# Altium footprint library ST封装.PcbLib: 1336 footprints (part 87 of 109)
Each footprint in its own frame and in the unit in brackets; x right, y up, seen from the top. Pads: shape width x height; smd on the part's side, far side on the other; paste and mask are expansions set on the pad; w line width, h text height; cw(c..) or ccw(c..) is an arc to the next point about the centre after c.
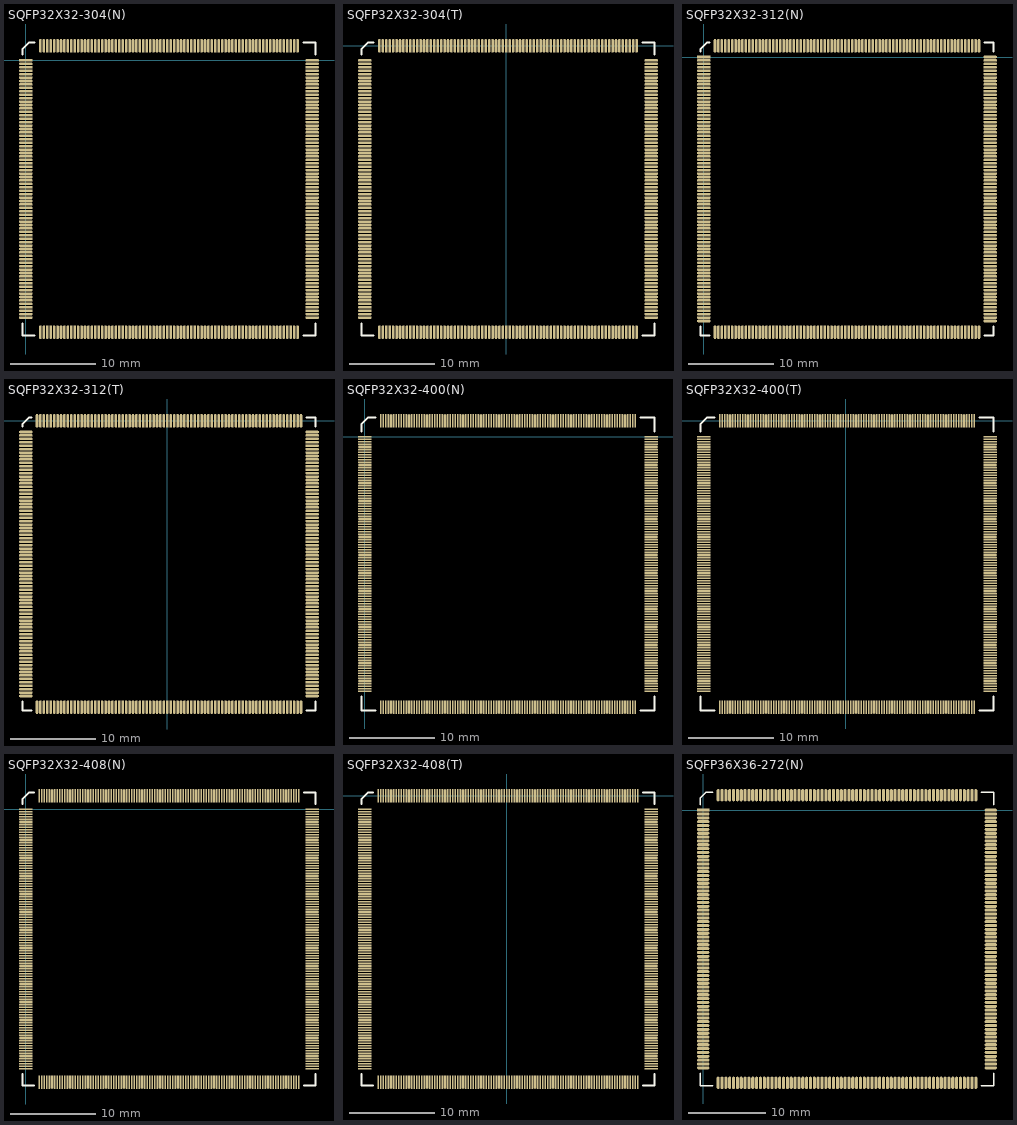
[diagram p86: the footprints below, top view; thin cyan lines are the x and y axes]

## SQFP32X32-304(N) [mm]
pads (304):
  rect 1.6x0.3 smd: 1(0,0)
  oval 1.6x0.3 smd: 2(0,-0.4) 3(0,-0.8) 4(0,-1.2) 5(0,-1.6) 6(0,-2) 7(0,-2.4) 8(0,-2.8) 9(0,-3.2) 10(0,-3.6) 11(0,-4) 12(0,-4.4) 13(0,-4.8) 14(0,-5.2) 15(0,-5.6) 16(0,-6) 17(0,-6.4) 18(0,-6.8) 19(0,-7.2) 20(0,-7.6) 21(0,-8) 22(0,-8.4) 23(0,-8.8) 24(0,-9.2) 25(0,-9.6) 26(0,-10) 27(0,-10.4) 28(0,-10.8) 29(0,-11.2) 30(0,-11.6) 31(0,-12) 32(0,-12.4) 33(0,-12.8) 34(0,-13.2) 35(0,-13.6) 36(0,-14) 37(0,-14.4) 38(0,-14.8) 39(0,-15.2) 40(0,-15.6) 41(0,-16) 42(0,-16.4) 43(0,-16.8) 44(0,-17.2) 45(0,-17.6) 46(0,-18) 47(0,-18.4) 48(0,-18.8) 49(0,-19.2) 50(0,-19.6) 51(0,-20) 52(0,-20.4) 53(0,-20.8) 54(0,-21.2) 55(0,-21.6) 56(0,-22) 57(0,-22.4) 58(0,-22.8) 59(0,-23.2) 60(0,-23.6) 61(0,-24) 62(0,-24.4) 63(0,-24.8) 64(0,-25.2) 65(0,-25.6) 66(0,-26) 67(0,-26.4) 68(0,-26.8) 69(0,-27.2) 70(0,-27.6) 71(0,-28) 72(0,-28.4) 73(0,-28.8) 74(0,-29.2) 75(0,-29.6) 76(0,-30) 153(33.4,-30) 154(33.4,-29.6) 155(33.4,-29.2) 156(33.4,-28.8) 157(33.4,-28.4) 158(33.4,-28) 159(33.4,-27.6) 160(33.4,-27.2) 161(33.4,-26.8) 162(33.4,-26.4) 163(33.4,-26) 164(33.4,-25.6) 165(33.4,-25.2) 166(33.4,-24.8) 167(33.4,-24.4) 168(33.4,-24) 169(33.4,-23.6) 170(33.4,-23.2) 171(33.4,-22.8) 172(33.4,-22.4) 173(33.4,-22) 174(33.4,-21.6) 175(33.4,-21.2) 176(33.4,-20.8) 177(33.4,-20.4) 178(33.4,-20) 179(33.4,-19.6) 180(33.4,-19.2) 181(33.4,-18.8) 182(33.4,-18.4) 183(33.4,-18) 184(33.4,-17.6) 185(33.4,-17.2) 186(33.4,-16.8) 187(33.4,-16.4) 188(33.4,-16) 189(33.4,-15.6) 190(33.4,-15.2) 191(33.4,-14.8) 192(33.4,-14.4) 193(33.4,-14) 194(33.4,-13.6) 195(33.4,-13.2) 196(33.4,-12.8) 197(33.4,-12.4) 198(33.4,-12) 199(33.4,-11.6) 200(33.4,-11.2) 201(33.4,-10.8) 202(33.4,-10.4) 203(33.4,-10) 204(33.4,-9.6) 205(33.4,-9.2) 206(33.4,-8.8) 207(33.4,-8.4) 208(33.4,-8) 209(33.4,-7.6) 210(33.4,-7.2) 211(33.4,-6.8) 212(33.4,-6.4) 213(33.4,-6) 214(33.4,-5.6) 215(33.4,-5.2) 216(33.4,-4.8) 217(33.4,-4.4) 218(33.4,-4) 219(33.4,-3.6) 220(33.4,-3.2) 221(33.4,-2.8) 222(33.4,-2.4) 223(33.4,-2) 224(33.4,-1.6) 225(33.4,-1.2) 226(33.4,-0.8) 227(33.4,-0.4) 228(33.4,0)
  oval 0.3x1.6 smd: 77(1.7,-31.7) 78(2.1,-31.7) 79(2.5,-31.7) 80(2.9,-31.7) 81(3.3,-31.7) 82(3.7,-31.7) 83(4.1,-31.7) 84(4.5,-31.7) 85(4.9,-31.7) 86(5.3,-31.7) 87(5.7,-31.7) 88(6.1,-31.7) 89(6.5,-31.7) 90(6.9,-31.7) 91(7.3,-31.7) 92(7.7,-31.7) 93(8.1,-31.7) 94(8.5,-31.7) 95(8.9,-31.7) 96(9.3,-31.7) 97(9.7,-31.7) 98(10.1,-31.7) 99(10.5,-31.7) 100(10.9,-31.7) 101(11.3,-31.7) 102(11.7,-31.7) 103(12.1,-31.7) 104(12.5,-31.7) 105(12.9,-31.7) 106(13.3,-31.7) 107(13.7,-31.7) 108(14.1,-31.7) 109(14.5,-31.7) 110(14.9,-31.7) 111(15.3,-31.7) 112(15.7,-31.7) 113(16.1,-31.7) 114(16.5,-31.7) 115(16.9,-31.7) 116(17.3,-31.7) 117(17.7,-31.7) 118(18.1,-31.7) 119(18.5,-31.7) 120(18.9,-31.7) 121(19.3,-31.7) 122(19.7,-31.7) 123(20.1,-31.7) 124(20.5,-31.7) 125(20.9,-31.7) 126(21.3,-31.7) 127(21.7,-31.7) 128(22.1,-31.7) 129(22.5,-31.7) 130(22.9,-31.7) 131(23.3,-31.7) 132(23.7,-31.7) 133(24.1,-31.7) 134(24.5,-31.7) 135(24.9,-31.7) 136(25.3,-31.7) 137(25.7,-31.7) 138(26.1,-31.7) 139(26.5,-31.7) 140(26.9,-31.7) 141(27.3,-31.7) 142(27.7,-31.7) 143(28.1,-31.7) 144(28.5,-31.7) 145(28.9,-31.7) 146(29.3,-31.7) 147(29.7,-31.7) 148(30.1,-31.7) 149(30.5,-31.7) 150(30.9,-31.7) 151(31.3,-31.7) 152(31.7,-31.7) 229(31.7,1.7) 230(31.3,1.7) 231(30.9,1.7) 232(30.5,1.7) 233(30.1,1.7) 234(29.7,1.7) 235(29.3,1.7) 236(28.9,1.7) 237(28.5,1.7) 238(28.1,1.7) 239(27.7,1.7) 240(27.3,1.7) 241(26.9,1.7) 242(26.5,1.7) 243(26.1,1.7) 244(25.7,1.7) 245(25.3,1.7) 246(24.9,1.7) 247(24.5,1.7) 248(24.1,1.7) 249(23.7,1.7) 250(23.3,1.7) 251(22.9,1.7) 252(22.5,1.7) 253(22.1,1.7) 254(21.7,1.7) 255(21.3,1.7) 256(20.9,1.7) 257(20.5,1.7) 258(20.1,1.7) 259(19.7,1.7) 260(19.3,1.7) 261(18.9,1.7) 262(18.5,1.7) 263(18.1,1.7) 264(17.7,1.7) 265(17.3,1.7) 266(16.9,1.7) 267(16.5,1.7) 268(16.1,1.7) 269(15.7,1.7) 270(15.3,1.7) 271(14.9,1.7) 272(14.5,1.7) 273(14.1,1.7) 274(13.7,1.7) 275(13.3,1.7) 276(12.9,1.7) 277(12.5,1.7) 278(12.1,1.7) 279(11.7,1.7) 280(11.3,1.7) 281(10.9,1.7) 282(10.5,1.7) 283(10.1,1.7) 284(9.7,1.7) 285(9.3,1.7) 286(8.9,1.7) 287(8.5,1.7) 288(8.1,1.7) 289(7.7,1.7) 290(7.3,1.7) 291(6.9,1.7) 292(6.5,1.7) 293(6.1,1.7) 294(5.7,1.7) 295(5.3,1.7) 296(4.9,1.7) 297(4.5,1.7) 298(4.1,1.7) 299(3.7,1.7) 300(3.3,1.7) 301(2.9,1.7) 302(2.5,1.7) 303(2.1,1.7) 304(1.7,1.7)
Top Overlay:
  lines w0.2: -0.4,-30.65 -0.4,-32.1 1.05,-32.1 ; -0.4,0.65 -0.4,1.3 0.4,2.1 1.05,2.1 ; 32.35,-32.1 33.8,-32.1 33.8,-30.65 ; 32.35,2.1 33.8,2.1 33.8,0.65

## SQFP32X32-304(T) [mm]
pads (304):
  rect 0.3x1.6 smd: 1(0,0)
  oval 0.3x1.6 smd: 2(-0.4,0) 3(-0.8,0) 4(-1.2,0) 5(-1.6,0) 6(-2,0) 7(-2.4,0) 8(-2.8,0) 9(-3.2,0) 10(-3.6,0) 11(-4,0) 12(-4.4,0) 13(-4.8,0) 14(-5.2,0) 15(-5.6,0) 16(-6,0) 17(-6.4,0) 18(-6.8,0) 19(-7.2,0) 20(-7.6,0) 21(-8,0) 22(-8.4,0) 23(-8.8,0) 24(-9.2,0) 25(-9.6,0) 26(-10,0) 27(-10.4,0) 28(-10.8,0) 29(-11.2,0) 30(-11.6,0) 31(-12,0) 32(-12.4,0) 33(-12.8,0) 34(-13.2,0) 35(-13.6,0) 36(-14,0) 37(-14.4,0) 38(-14.8,0) 115(-14.8,-33.4) 116(-14.4,-33.4) 117(-14,-33.4) 118(-13.6,-33.4) 119(-13.2,-33.4) 120(-12.8,-33.4) 121(-12.4,-33.4) 122(-12,-33.4) 123(-11.6,-33.4) 124(-11.2,-33.4) 125(-10.8,-33.4) 126(-10.4,-33.4) 127(-10,-33.4) 128(-9.6,-33.4) 129(-9.2,-33.4) 130(-8.8,-33.4) 131(-8.4,-33.4) 132(-8,-33.4) 133(-7.6,-33.4) 134(-7.2,-33.4) 135(-6.8,-33.4) 136(-6.4,-33.4) 137(-6,-33.4) 138(-5.6,-33.4) 139(-5.2,-33.4) 140(-4.8,-33.4) 141(-4.4,-33.4) 142(-4,-33.4) 143(-3.6,-33.4) 144(-3.2,-33.4) 145(-2.8,-33.4) 146(-2.4,-33.4) 147(-2,-33.4) 148(-1.6,-33.4) 149(-1.2,-33.4) 150(-0.8,-33.4) 151(-0.4,-33.4) 152(0,-33.4) 153(0.4,-33.4) 154(0.8,-33.4) 155(1.2,-33.4) 156(1.6,-33.4) 157(2,-33.4) 158(2.4,-33.4) 159(2.8,-33.4) 160(3.2,-33.4) 161(3.6,-33.4) 162(4,-33.4) 163(4.4,-33.4) 164(4.8,-33.4) 165(5.2,-33.4) 166(5.6,-33.4) 167(6,-33.4) 168(6.4,-33.4) 169(6.8,-33.4) 170(7.2,-33.4) 171(7.6,-33.4) 172(8,-33.4) 173(8.4,-33.4) 174(8.8,-33.4) 175(9.2,-33.4) 176(9.6,-33.4) 177(10,-33.4) 178(10.4,-33.4) 179(10.8,-33.4) 180(11.2,-33.4) 181(11.6,-33.4) 182(12,-33.4) 183(12.4,-33.4) 184(12.8,-33.4) 185(13.2,-33.4) 186(13.6,-33.4) 187(14,-33.4) 188(14.4,-33.4) 189(14.8,-33.4) 190(15.2,-33.4) 267(15.2,0) 268(14.8,0) 269(14.4,0) 270(14,0) 271(13.6,0) 272(13.2,0) 273(12.8,0) 274(12.4,0) 275(12,0) 276(11.6,0) 277(11.2,0) 278(10.8,0) 279(10.4,0) 280(10,0) 281(9.6,0) 282(9.2,0) 283(8.8,0) 284(8.4,0) 285(8,0) 286(7.6,0) 287(7.2,0) 288(6.8,0) 289(6.4,0) 290(6,0) 291(5.6,0) 292(5.2,0) 293(4.8,0) 294(4.4,0) 295(4,0) 296(3.6,0) 297(3.2,0) 298(2.8,0) 299(2.4,0) 300(2,0) 301(1.6,0) 302(1.2,0) 303(0.8,0) 304(0.4,0)
  oval 1.6x0.3 smd: 39(-16.5,-1.7) 40(-16.5,-2.1) 41(-16.5,-2.5) 42(-16.5,-2.9) 43(-16.5,-3.3) 44(-16.5,-3.7) 45(-16.5,-4.1) 46(-16.5,-4.5) 47(-16.5,-4.9) 48(-16.5,-5.3) 49(-16.5,-5.7) 50(-16.5,-6.1) 51(-16.5,-6.5) 52(-16.5,-6.9) 53(-16.5,-7.3) 54(-16.5,-7.7) 55(-16.5,-8.1) 56(-16.5,-8.5) 57(-16.5,-8.9) 58(-16.5,-9.3) 59(-16.5,-9.7) 60(-16.5,-10.1) 61(-16.5,-10.5) 62(-16.5,-10.9) 63(-16.5,-11.3) 64(-16.5,-11.7) 65(-16.5,-12.1) 66(-16.5,-12.5) 67(-16.5,-12.9) 68(-16.5,-13.3) 69(-16.5,-13.7) 70(-16.5,-14.1) 71(-16.5,-14.5) 72(-16.5,-14.9) 73(-16.5,-15.3) 74(-16.5,-15.7) 75(-16.5,-16.1) 76(-16.5,-16.5) 77(-16.5,-16.9) 78(-16.5,-17.3) 79(-16.5,-17.7) 80(-16.5,-18.1) 81(-16.5,-18.5) 82(-16.5,-18.9) 83(-16.5,-19.3) 84(-16.5,-19.7) 85(-16.5,-20.1) 86(-16.5,-20.5) 87(-16.5,-20.9) 88(-16.5,-21.3) 89(-16.5,-21.7) 90(-16.5,-22.1) 91(-16.5,-22.5) 92(-16.5,-22.9) 93(-16.5,-23.3) 94(-16.5,-23.7) 95(-16.5,-24.1) 96(-16.5,-24.5) 97(-16.5,-24.9) 98(-16.5,-25.3) 99(-16.5,-25.7) 100(-16.5,-26.1) 101(-16.5,-26.5) 102(-16.5,-26.9) 103(-16.5,-27.3) 104(-16.5,-27.7) 105(-16.5,-28.1) 106(-16.5,-28.5) 107(-16.5,-28.9) 108(-16.5,-29.3) 109(-16.5,-29.7) 110(-16.5,-30.1) 111(-16.5,-30.5) 112(-16.5,-30.9) 113(-16.5,-31.3) 114(-16.5,-31.7) 191(16.9,-31.7) 192(16.9,-31.3) 193(16.9,-30.9) 194(16.9,-30.5) 195(16.9,-30.1) 196(16.9,-29.7) 197(16.9,-29.3) 198(16.9,-28.9) 199(16.9,-28.5) 200(16.9,-28.1) 201(16.9,-27.7) 202(16.9,-27.3) 203(16.9,-26.9) 204(16.9,-26.5) 205(16.9,-26.1) 206(16.9,-25.7) 207(16.9,-25.3) 208(16.9,-24.9) 209(16.9,-24.5) 210(16.9,-24.1) 211(16.9,-23.7) 212(16.9,-23.3) 213(16.9,-22.9) 214(16.9,-22.5) 215(16.9,-22.1) 216(16.9,-21.7) 217(16.9,-21.3) 218(16.9,-20.9) 219(16.9,-20.5) 220(16.9,-20.1) 221(16.9,-19.7) 222(16.9,-19.3) 223(16.9,-18.9) 224(16.9,-18.5) 225(16.9,-18.1) 226(16.9,-17.7) 227(16.9,-17.3) 228(16.9,-16.9) 229(16.9,-16.5) 230(16.9,-16.1) 231(16.9,-15.7) 232(16.9,-15.3) 233(16.9,-14.9) 234(16.9,-14.5) 235(16.9,-14.1) 236(16.9,-13.7) 237(16.9,-13.3) 238(16.9,-12.9) 239(16.9,-12.5) 240(16.9,-12.1) 241(16.9,-11.7) 242(16.9,-11.3) 243(16.9,-10.9) 244(16.9,-10.5) 245(16.9,-10.1) 246(16.9,-9.7) 247(16.9,-9.3) 248(16.9,-8.9) 249(16.9,-8.5) 250(16.9,-8.1) 251(16.9,-7.7) 252(16.9,-7.3) 253(16.9,-6.9) 254(16.9,-6.5) 255(16.9,-6.1) 256(16.9,-5.7) 257(16.9,-5.3) 258(16.9,-4.9) 259(16.9,-4.5) 260(16.9,-4.1) 261(16.9,-3.7) 262(16.9,-3.3) 263(16.9,-2.9) 264(16.9,-2.5) 265(16.9,-2.1) 266(16.9,-1.7)
Top Overlay:
  lines w0.2: -16.9,-32.35 -16.9,-33.8 -15.45,-33.8 ; -16.9,-1.05 -16.9,-0.4 -16.1,0.4 -15.45,0.4 ; 15.85,-33.8 17.3,-33.8 17.3,-32.35 ; 15.85,0.4 17.3,0.4 17.3,-1.05

## SQFP32X32-312(N) [mm]
pads (312):
  rect 1.6x0.3 smd: 1(0,0)
  oval 1.6x0.3 smd: 2(0,-0.4) 3(0,-0.8) 4(0,-1.2) 5(0,-1.6) 6(0,-2) 7(0,-2.4) 8(0,-2.8) 9(0,-3.2) 10(0,-3.6) 11(0,-4) 12(0,-4.4) 13(0,-4.8) 14(0,-5.2) 15(0,-5.6) 16(0,-6) 17(0,-6.4) 18(0,-6.8) 19(0,-7.2) 20(0,-7.6) 21(0,-8) 22(0,-8.4) 23(0,-8.8) 24(0,-9.2) 25(0,-9.6) 26(0,-10) 27(0,-10.4) 28(0,-10.8) 29(0,-11.2) 30(0,-11.6) 31(0,-12) 32(0,-12.4) 33(0,-12.8) 34(0,-13.2) 35(0,-13.6) 36(0,-14) 37(0,-14.4) 38(0,-14.8) 39(0,-15.2) 40(0,-15.6) 41(0,-16) 42(0,-16.4) 43(0,-16.8) 44(0,-17.2) 45(0,-17.6) 46(0,-18) 47(0,-18.4) 48(0,-18.8) 49(0,-19.2) 50(0,-19.6) 51(0,-20) 52(0,-20.4) 53(0,-20.8) 54(0,-21.2) 55(0,-21.6) 56(0,-22) 57(0,-22.4) 58(0,-22.8) 59(0,-23.2) 60(0,-23.6) 61(0,-24) 62(0,-24.4) 63(0,-24.8) 64(0,-25.2) 65(0,-25.6) 66(0,-26) 67(0,-26.4) 68(0,-26.8) 69(0,-27.2) 70(0,-27.6) 71(0,-28) 72(0,-28.4) 73(0,-28.8) 74(0,-29.2) 75(0,-29.6) 76(0,-30) 77(0,-30.4) 78(0,-30.8) 157(33.4,-30.8) 158(33.4,-30.4) 159(33.4,-30) 160(33.4,-29.6) 161(33.4,-29.2) 162(33.4,-28.8) 163(33.4,-28.4) 164(33.4,-28) 165(33.4,-27.6) 166(33.4,-27.2) 167(33.4,-26.8) 168(33.4,-26.4) 169(33.4,-26) 170(33.4,-25.6) 171(33.4,-25.2) 172(33.4,-24.8) 173(33.4,-24.4) 174(33.4,-24) 175(33.4,-23.6) 176(33.4,-23.2) 177(33.4,-22.8) 178(33.4,-22.4) 179(33.4,-22) 180(33.4,-21.6) 181(33.4,-21.2) 182(33.4,-20.8) 183(33.4,-20.4) 184(33.4,-20) 185(33.4,-19.6) 186(33.4,-19.2) 187(33.4,-18.8) 188(33.4,-18.4) 189(33.4,-18) 190(33.4,-17.6) 191(33.4,-17.2) 192(33.4,-16.8) 193(33.4,-16.4) 194(33.4,-16) 195(33.4,-15.6) 196(33.4,-15.2) 197(33.4,-14.8) 198(33.4,-14.4) 199(33.4,-14) 200(33.4,-13.6) 201(33.4,-13.2) 202(33.4,-12.8) 203(33.4,-12.4) 204(33.4,-12) 205(33.4,-11.6) 206(33.4,-11.2) 207(33.4,-10.8) 208(33.4,-10.4) 209(33.4,-10) 210(33.4,-9.6) 211(33.4,-9.2) 212(33.4,-8.8) 213(33.4,-8.4) 214(33.4,-8) 215(33.4,-7.6) 216(33.4,-7.2) 217(33.4,-6.8) 218(33.4,-6.4) 219(33.4,-6) 220(33.4,-5.6) 221(33.4,-5.2) 222(33.4,-4.8) 223(33.4,-4.4) 224(33.4,-4) 225(33.4,-3.6) 226(33.4,-3.2) 227(33.4,-2.8) 228(33.4,-2.4) 229(33.4,-2) 230(33.4,-1.6) 231(33.4,-1.2) 232(33.4,-0.8) 233(33.4,-0.4) 234(33.4,0)
  oval 0.3x1.6 smd: 79(1.3,-32.1) 80(1.7,-32.1) 81(2.1,-32.1) 82(2.5,-32.1) 83(2.9,-32.1) 84(3.3,-32.1) 85(3.7,-32.1) 86(4.1,-32.1) 87(4.5,-32.1) 88(4.9,-32.1) 89(5.3,-32.1) 90(5.7,-32.1) 91(6.1,-32.1) 92(6.5,-32.1) 93(6.9,-32.1) 94(7.3,-32.1) 95(7.7,-32.1) 96(8.1,-32.1) 97(8.5,-32.1) 98(8.9,-32.1) 99(9.3,-32.1) 100(9.7,-32.1) 101(10.1,-32.1) 102(10.5,-32.1) 103(10.9,-32.1) 104(11.3,-32.1) 105(11.7,-32.1) 106(12.1,-32.1) 107(12.5,-32.1) 108(12.9,-32.1) 109(13.3,-32.1) 110(13.7,-32.1) 111(14.1,-32.1) 112(14.5,-32.1) 113(14.9,-32.1) 114(15.3,-32.1) 115(15.7,-32.1) 116(16.1,-32.1) 117(16.5,-32.1) 118(16.9,-32.1) 119(17.3,-32.1) 120(17.7,-32.1) 121(18.1,-32.1) 122(18.5,-32.1) 123(18.9,-32.1) 124(19.3,-32.1) 125(19.7,-32.1) 126(20.1,-32.1) 127(20.5,-32.1) 128(20.9,-32.1) 129(21.3,-32.1) 130(21.7,-32.1) 131(22.1,-32.1) 132(22.5,-32.1) 133(22.9,-32.1) 134(23.3,-32.1) 135(23.7,-32.1) 136(24.1,-32.1) 137(24.5,-32.1) 138(24.9,-32.1) 139(25.3,-32.1) 140(25.7,-32.1) 141(26.1,-32.1) 142(26.5,-32.1) 143(26.9,-32.1) 144(27.3,-32.1) 145(27.7,-32.1) 146(28.1,-32.1) 147(28.5,-32.1) 148(28.9,-32.1) 149(29.3,-32.1) 150(29.7,-32.1) 151(30.1,-32.1) 152(30.5,-32.1) 153(30.9,-32.1) 154(31.3,-32.1) 155(31.7,-32.1) 156(32.1,-32.1) 235(32.1,1.3) 236(31.7,1.3) 237(31.3,1.3) 238(30.9,1.3) 239(30.5,1.3) 240(30.1,1.3) 241(29.7,1.3) 242(29.3,1.3) 243(28.9,1.3) 244(28.5,1.3) 245(28.1,1.3) 246(27.7,1.3) 247(27.3,1.3) 248(26.9,1.3) 249(26.5,1.3) 250(26.1,1.3) 251(25.7,1.3) 252(25.3,1.3) 253(24.9,1.3) 254(24.5,1.3) 255(24.1,1.3) 256(23.7,1.3) 257(23.3,1.3) 258(22.9,1.3) 259(22.5,1.3) 260(22.1,1.3) 261(21.7,1.3) 262(21.3,1.3) 263(20.9,1.3) 264(20.5,1.3) 265(20.1,1.3) 266(19.7,1.3) 267(19.3,1.3) 268(18.9,1.3) 269(18.5,1.3) 270(18.1,1.3) 271(17.7,1.3) 272(17.3,1.3) 273(16.9,1.3) 274(16.5,1.3) 275(16.1,1.3) 276(15.7,1.3) 277(15.3,1.3) 278(14.9,1.3) 279(14.5,1.3) 280(14.1,1.3) 281(13.7,1.3) 282(13.3,1.3) 283(12.9,1.3) 284(12.5,1.3) 285(12.1,1.3) 286(11.7,1.3) 287(11.3,1.3) 288(10.9,1.3) 289(10.5,1.3) 290(10.1,1.3) 291(9.7,1.3) 292(9.3,1.3) 293(8.9,1.3) 294(8.5,1.3) 295(8.1,1.3) 296(7.7,1.3) 297(7.3,1.3) 298(6.9,1.3) 299(6.5,1.3) 300(6.1,1.3) 301(5.7,1.3) 302(5.3,1.3) 303(4.9,1.3) 304(4.5,1.3) 305(4.1,1.3) 306(3.7,1.3) 307(3.3,1.3) 308(2.9,1.3) 309(2.5,1.3) 310(2.1,1.3) 311(1.7,1.3) 312(1.3,1.3)
Top Overlay:
  lines w0.2: -0.4,-31.45 -0.4,-32.5 0.65,-32.5 ; -0.4,0.65 -0.4,0.9 0.4,1.7 0.65,1.7 ; 32.75,-32.5 33.8,-32.5 33.8,-31.45 ; 32.75,1.7 33.8,1.7 33.8,0.65

## SQFP32X32-312(T) [mm]
pads (312):
  rect 0.3x1.6 smd: 1(0,0)
  oval 0.3x1.6 smd: 2(-0.4,0) 3(-0.8,0) 4(-1.2,0) 5(-1.6,0) 6(-2,0) 7(-2.4,0) 8(-2.8,0) 9(-3.2,0) 10(-3.6,0) 11(-4,0) 12(-4.4,0) 13(-4.8,0) 14(-5.2,0) 15(-5.6,0) 16(-6,0) 17(-6.4,0) 18(-6.8,0) 19(-7.2,0) 20(-7.6,0) 21(-8,0) 22(-8.4,0) 23(-8.8,0) 24(-9.2,0) 25(-9.6,0) 26(-10,0) 27(-10.4,0) 28(-10.8,0) 29(-11.2,0) 30(-11.6,0) 31(-12,0) 32(-12.4,0) 33(-12.8,0) 34(-13.2,0) 35(-13.6,0) 36(-14,0) 37(-14.4,0) 38(-14.8,0) 39(-15.2,0) 118(-15.2,-33.4) 119(-14.8,-33.4) 120(-14.4,-33.4) 121(-14,-33.4) 122(-13.6,-33.4) 123(-13.2,-33.4) 124(-12.8,-33.4) 125(-12.4,-33.4) 126(-12,-33.4) 127(-11.6,-33.4) 128(-11.2,-33.4) 129(-10.8,-33.4) 130(-10.4,-33.4) 131(-10,-33.4) 132(-9.6,-33.4) 133(-9.2,-33.4) 134(-8.8,-33.4) 135(-8.4,-33.4) 136(-8,-33.4) 137(-7.6,-33.4) 138(-7.2,-33.4) 139(-6.8,-33.4) 140(-6.4,-33.4) 141(-6,-33.4) 142(-5.6,-33.4) 143(-5.2,-33.4) 144(-4.8,-33.4) 145(-4.4,-33.4) 146(-4,-33.4) 147(-3.6,-33.4) 148(-3.2,-33.4) 149(-2.8,-33.4) 150(-2.4,-33.4) 151(-2,-33.4) 152(-1.6,-33.4) 153(-1.2,-33.4) 154(-0.8,-33.4) 155(-0.4,-33.4) 156(0,-33.4) 157(0.4,-33.4) 158(0.8,-33.4) 159(1.2,-33.4) 160(1.6,-33.4) 161(2,-33.4) 162(2.4,-33.4) 163(2.8,-33.4) 164(3.2,-33.4) 165(3.6,-33.4) 166(4,-33.4) 167(4.4,-33.4) 168(4.8,-33.4) 169(5.2,-33.4) 170(5.6,-33.4) 171(6,-33.4) 172(6.4,-33.4) 173(6.8,-33.4) 174(7.2,-33.4) 175(7.6,-33.4) 176(8,-33.4) 177(8.4,-33.4) 178(8.8,-33.4) 179(9.2,-33.4) 180(9.6,-33.4) 181(10,-33.4) 182(10.4,-33.4) 183(10.8,-33.4) 184(11.2,-33.4) 185(11.6,-33.4) 186(12,-33.4) 187(12.4,-33.4) 188(12.8,-33.4) 189(13.2,-33.4) 190(13.6,-33.4) 191(14,-33.4) 192(14.4,-33.4) 193(14.8,-33.4) 194(15.2,-33.4) 195(15.6,-33.4) 274(15.6,0) 275(15.2,0) 276(14.8,0) 277(14.4,0) 278(14,0) 279(13.6,0) 280(13.2,0) 281(12.8,0) 282(12.4,0) 283(12,0) 284(11.6,0) 285(11.2,0) 286(10.8,0) 287(10.4,0) 288(10,0) 289(9.6,0) 290(9.2,0) 291(8.8,0) 292(8.4,0) 293(8,0) 294(7.6,0) 295(7.2,0) 296(6.8,0) 297(6.4,0) 298(6,0) 299(5.6,0) 300(5.2,0) 301(4.8,0) 302(4.4,0) 303(4,0) 304(3.6,0) 305(3.2,0) 306(2.8,0) 307(2.4,0) 308(2,0) 309(1.6,0) 310(1.2,0) 311(0.8,0) 312(0.4,0)
  oval 1.6x0.3 smd: 40(-16.5,-1.3) 41(-16.5,-1.7) 42(-16.5,-2.1) 43(-16.5,-2.5) 44(-16.5,-2.9) 45(-16.5,-3.3) 46(-16.5,-3.7) 47(-16.5,-4.1) 48(-16.5,-4.5) 49(-16.5,-4.9) 50(-16.5,-5.3) 51(-16.5,-5.7) 52(-16.5,-6.1) 53(-16.5,-6.5) 54(-16.5,-6.9) 55(-16.5,-7.3) 56(-16.5,-7.7) 57(-16.5,-8.1) 58(-16.5,-8.5) 59(-16.5,-8.9) 60(-16.5,-9.3) 61(-16.5,-9.7) 62(-16.5,-10.1) 63(-16.5,-10.5) 64(-16.5,-10.9) 65(-16.5,-11.3) 66(-16.5,-11.7) 67(-16.5,-12.1) 68(-16.5,-12.5) 69(-16.5,-12.9) 70(-16.5,-13.3) 71(-16.5,-13.7) 72(-16.5,-14.1) 73(-16.5,-14.5) 74(-16.5,-14.9) 75(-16.5,-15.3) 76(-16.5,-15.7) 77(-16.5,-16.1) 78(-16.5,-16.5) 79(-16.5,-16.9) 80(-16.5,-17.3) 81(-16.5,-17.7) 82(-16.5,-18.1) 83(-16.5,-18.5) 84(-16.5,-18.9) 85(-16.5,-19.3) 86(-16.5,-19.7) 87(-16.5,-20.1) 88(-16.5,-20.5) 89(-16.5,-20.9) 90(-16.5,-21.3) 91(-16.5,-21.7) 92(-16.5,-22.1) 93(-16.5,-22.5) 94(-16.5,-22.9) 95(-16.5,-23.3) 96(-16.5,-23.7) 97(-16.5,-24.1) 98(-16.5,-24.5) 99(-16.5,-24.9) 100(-16.5,-25.3) 101(-16.5,-25.7) 102(-16.5,-26.1) 103(-16.5,-26.5) 104(-16.5,-26.9) 105(-16.5,-27.3) 106(-16.5,-27.7) 107(-16.5,-28.1) 108(-16.5,-28.5) 109(-16.5,-28.9) 110(-16.5,-29.3) 111(-16.5,-29.7) 112(-16.5,-30.1) 113(-16.5,-30.5) 114(-16.5,-30.9) 115(-16.5,-31.3) 116(-16.5,-31.7) 117(-16.5,-32.1) 196(16.9,-32.1) 197(16.9,-31.7) 198(16.9,-31.3) 199(16.9,-30.9) 200(16.9,-30.5) 201(16.9,-30.1) 202(16.9,-29.7) 203(16.9,-29.3) 204(16.9,-28.9) 205(16.9,-28.5) 206(16.9,-28.1) 207(16.9,-27.7) 208(16.9,-27.3) 209(16.9,-26.9) 210(16.9,-26.5) 211(16.9,-26.1) 212(16.9,-25.7) 213(16.9,-25.3) 214(16.9,-24.9) 215(16.9,-24.5) 216(16.9,-24.1) 217(16.9,-23.7) 218(16.9,-23.3) 219(16.9,-22.9) 220(16.9,-22.5) 221(16.9,-22.1) 222(16.9,-21.7) 223(16.9,-21.3) 224(16.9,-20.9) 225(16.9,-20.5) 226(16.9,-20.1) 227(16.9,-19.7) 228(16.9,-19.3) 229(16.9,-18.9) 230(16.9,-18.5) 231(16.9,-18.1) 232(16.9,-17.7) 233(16.9,-17.3) 234(16.9,-16.9) 235(16.9,-16.5) 236(16.9,-16.1) 237(16.9,-15.7) 238(16.9,-15.3) 239(16.9,-14.9) 240(16.9,-14.5) 241(16.9,-14.1) 242(16.9,-13.7) 243(16.9,-13.3) 244(16.9,-12.9) 245(16.9,-12.5) 246(16.9,-12.1) 247(16.9,-11.7) 248(16.9,-11.3) 249(16.9,-10.9) 250(16.9,-10.5) 251(16.9,-10.1) 252(16.9,-9.7) 253(16.9,-9.3) 254(16.9,-8.9) 255(16.9,-8.5) 256(16.9,-8.1) 257(16.9,-7.7) 258(16.9,-7.3) 259(16.9,-6.9) 260(16.9,-6.5) 261(16.9,-6.1) 262(16.9,-5.7) 263(16.9,-5.3) 264(16.9,-4.9) 265(16.9,-4.5) 266(16.9,-4.1) 267(16.9,-3.7) 268(16.9,-3.3) 269(16.9,-2.9) 270(16.9,-2.5) 271(16.9,-2.1) 272(16.9,-1.7) 273(16.9,-1.3)
Top Overlay:
  lines w0.2: -16.9,-32.75 -16.9,-33.8 -15.85,-33.8 ; -16.9,-0.65 -16.9,-0.4 -16.1,0.4 -15.85,0.4 ; 16.25,-33.8 17.3,-33.8 17.3,-32.75 ; 16.25,0.4 17.3,0.4 17.3,-0.65

## SQFP32X32-400(N) [mm]
pads (400):
  rect 1.6x0.2 smd: 1(0,0)
  oval 1.6x0.2 smd: 2(0,-0.3) 3(0,-0.6) 4(0,-0.9) 5(0,-1.2) 6(0,-1.5) 7(0,-1.8) 8(0,-2.1) 9(0,-2.4) 10(0,-2.7) 11(0,-3) 12(0,-3.3) 13(0,-3.6) 14(0,-3.9) 15(0,-4.2) 16(0,-4.5) 17(0,-4.8) 18(0,-5.1) 19(0,-5.4) 20(0,-5.7) 21(0,-6) 22(0,-6.3) 23(0,-6.6) 24(0,-6.9) 25(0,-7.2) 26(0,-7.5) 27(0,-7.8) 28(0,-8.1) 29(0,-8.4) 30(0,-8.7) 31(0,-9) 32(0,-9.3) 33(0,-9.6) 34(0,-9.9) 35(0,-10.2) 36(0,-10.5) 37(0,-10.8) 38(0,-11.1) 39(0,-11.4) 40(0,-11.7) 41(0,-12) 42(0,-12.3) 43(0,-12.6) 44(0,-12.9) 45(0,-13.2) 46(0,-13.5) 47(0,-13.8) 48(0,-14.1) 49(0,-14.4) 50(0,-14.7) 51(0,-15) 52(0,-15.3) 53(0,-15.6) 54(0,-15.9) 55(0,-16.2) 56(0,-16.5) 57(0,-16.8) 58(0,-17.1) 59(0,-17.4) 60(0,-17.7) 61(0,-18) 62(0,-18.3) 63(0,-18.6) 64(0,-18.9) 65(0,-19.2) 66(0,-19.5) 67(0,-19.8) 68(0,-20.1) 69(0,-20.4) 70(0,-20.7) 71(0,-21) 72(0,-21.3) 73(0,-21.6) 74(0,-21.9) 75(0,-22.2) 76(0,-22.5) 77(0,-22.8) 78(0,-23.1) 79(0,-23.4) 80(0,-23.7) 81(0,-24) 82(0,-24.3) 83(0,-24.6) 84(0,-24.9) 85(0,-25.2) 86(0,-25.5) 87(0,-25.8) 88(0,-26.1) 89(0,-26.4) 90(0,-26.7) 91(0,-27) 92(0,-27.3) 93(0,-27.6) 94(0,-27.9) 95(0,-28.2) 96(0,-28.5) 97(0,-28.8) 98(0,-29.1) 99(0,-29.4) 100(0,-29.7) 201(33.4,-29.7) 202(33.4,-29.4) 203(33.4,-29.1) 204(33.4,-28.8) 205(33.4,-28.5) 206(33.4,-28.2) 207(33.4,-27.9) 208(33.4,-27.6) 209(33.4,-27.3) 210(33.4,-27) 211(33.4,-26.7) 212(33.4,-26.4) 213(33.4,-26.1) 214(33.4,-25.8) 215(33.4,-25.5) 216(33.4,-25.2) 217(33.4,-24.9) 218(33.4,-24.6) 219(33.4,-24.3) 220(33.4,-24) 221(33.4,-23.7) 222(33.4,-23.4) 223(33.4,-23.1) 224(33.4,-22.8) 225(33.4,-22.5) 226(33.4,-22.2) 227(33.4,-21.9) 228(33.4,-21.6) 229(33.4,-21.3) 230(33.4,-21) 231(33.4,-20.7) 232(33.4,-20.4) 233(33.4,-20.1) 234(33.4,-19.8) 235(33.4,-19.5) 236(33.4,-19.2) 237(33.4,-18.9) 238(33.4,-18.6) 239(33.4,-18.3) 240(33.4,-18) 241(33.4,-17.7) 242(33.4,-17.4) 243(33.4,-17.1) 244(33.4,-16.8) 245(33.4,-16.5) 246(33.4,-16.2) 247(33.4,-15.9) 248(33.4,-15.6) 249(33.4,-15.3) 250(33.4,-15) 251(33.4,-14.7) 252(33.4,-14.4) 253(33.4,-14.1) 254(33.4,-13.8) 255(33.4,-13.5) 256(33.4,-13.2) 257(33.4,-12.9) 258(33.4,-12.6) 259(33.4,-12.3) 260(33.4,-12) 261(33.4,-11.7) 262(33.4,-11.4) 263(33.4,-11.1) 264(33.4,-10.8) 265(33.4,-10.5) 266(33.4,-10.2) 267(33.4,-9.9) 268(33.4,-9.6) 269(33.4,-9.3) 270(33.4,-9) 271(33.4,-8.7) 272(33.4,-8.4) 273(33.4,-8.1) 274(33.4,-7.8) 275(33.4,-7.5) 276(33.4,-7.2) 277(33.4,-6.9) 278(33.4,-6.6) 279(33.4,-6.3) 280(33.4,-6) 281(33.4,-5.7) 282(33.4,-5.4) 283(33.4,-5.1) 284(33.4,-4.8) 285(33.4,-4.5) 286(33.4,-4.2) 287(33.4,-3.9) 288(33.4,-3.6) 289(33.4,-3.3) 290(33.4,-3) 291(33.4,-2.7) 292(33.4,-2.4) 293(33.4,-2.1) 294(33.4,-1.8) 295(33.4,-1.5) 296(33.4,-1.2) 297(33.4,-0.9) 298(33.4,-0.6) 299(33.4,-0.3) 300(33.4,0)
  oval 0.2x1.6 smd: 101(1.85,-31.55) 102(2.15,-31.55) 103(2.45,-31.55) 104(2.75,-31.55) 105(3.05,-31.55) 106(3.35,-31.55) 107(3.65,-31.55) 108(3.95,-31.55) 109(4.25,-31.55) 110(4.55,-31.55) 111(4.85,-31.55) 112(5.15,-31.55) 113(5.45,-31.55) 114(5.75,-31.55) 115(6.05,-31.55) 116(6.35,-31.55) 117(6.65,-31.55) 118(6.95,-31.55) 119(7.25,-31.55) 120(7.55,-31.55) 121(7.85,-31.55) 122(8.15,-31.55) 123(8.45,-31.55) 124(8.75,-31.55) 125(9.05,-31.55) 126(9.35,-31.55) 127(9.65,-31.55) 128(9.95,-31.55) 129(10.25,-31.55) 130(10.55,-31.55) 131(10.85,-31.55) 132(11.15,-31.55) 133(11.45,-31.55) 134(11.75,-31.55) 135(12.05,-31.55) 136(12.35,-31.55) 137(12.65,-31.55) 138(12.95,-31.55) 139(13.25,-31.55) 140(13.55,-31.55) 141(13.85,-31.55) 142(14.15,-31.55) 143(14.45,-31.55) 144(14.75,-31.55) 145(15.05,-31.55) 146(15.35,-31.55) 147(15.65,-31.55) 148(15.95,-31.55) 149(16.25,-31.55) 150(16.55,-31.55) 151(16.85,-31.55) 152(17.15,-31.55) 153(17.45,-31.55) 154(17.75,-31.55) 155(18.05,-31.55) 156(18.35,-31.55) 157(18.65,-31.55) 158(18.95,-31.55) 159(19.25,-31.55) 160(19.55,-31.55) 161(19.85,-31.55) 162(20.15,-31.55) 163(20.45,-31.55) 164(20.75,-31.55) 165(21.05,-31.55) 166(21.35,-31.55) 167(21.65,-31.55) 168(21.95,-31.55) 169(22.25,-31.55) 170(22.55,-31.55) 171(22.85,-31.55) 172(23.15,-31.55) 173(23.45,-31.55) 174(23.75,-31.55) 175(24.05,-31.55) 176(24.35,-31.55) 177(24.65,-31.55) 178(24.95,-31.55) 179(25.25,-31.55) 180(25.55,-31.55) 181(25.85,-31.55) 182(26.15,-31.55) 183(26.45,-31.55) 184(26.75,-31.55) 185(27.05,-31.55) 186(27.35,-31.55) 187(27.65,-31.55) 188(27.95,-31.55) 189(28.25,-31.55) 190(28.55,-31.55) 191(28.85,-31.55) 192(29.15,-31.55) 193(29.45,-31.55) 194(29.75,-31.55) 195(30.05,-31.55) 196(30.35,-31.55) 197(30.65,-31.55) 198(30.95,-31.55) 199(31.25,-31.55) 200(31.55,-31.55) 301(31.55,1.85) 302(31.25,1.85) 303(30.95,1.85) 304(30.65,1.85) 305(30.35,1.85) 306(30.05,1.85) 307(29.75,1.85) 308(29.45,1.85) 309(29.15,1.85) 310(28.85,1.85) 311(28.55,1.85) 312(28.25,1.85) 313(27.95,1.85) 314(27.65,1.85) 315(27.35,1.85) 316(27.05,1.85) 317(26.75,1.85) 318(26.45,1.85) 319(26.15,1.85) 320(25.85,1.85) 321(25.55,1.85) 322(25.25,1.85) 323(24.95,1.85) 324(24.65,1.85) 325(24.35,1.85) 326(24.05,1.85) 327(23.75,1.85) 328(23.45,1.85) 329(23.15,1.85) 330(22.85,1.85) 331(22.55,1.85) 332(22.25,1.85) 333(21.95,1.85) 334(21.65,1.85) 335(21.35,1.85) 336(21.05,1.85) 337(20.75,1.85) 338(20.45,1.85) 339(20.15,1.85) 340(19.85,1.85) 341(19.55,1.85) 342(19.25,1.85) 343(18.95,1.85) 344(18.65,1.85) 345(18.35,1.85) 346(18.05,1.85) 347(17.75,1.85) 348(17.45,1.85) 349(17.15,1.85) 350(16.85,1.85) 351(16.55,1.85) 352(16.25,1.85) 353(15.95,1.85) 354(15.65,1.85) 355(15.35,1.85) 356(15.05,1.85) 357(14.75,1.85) 358(14.45,1.85) 359(14.15,1.85) 360(13.85,1.85) 361(13.55,1.85) 362(13.25,1.85) 363(12.95,1.85) 364(12.65,1.85) 365(12.35,1.85) 366(12.05,1.85) 367(11.75,1.85) 368(11.45,1.85) 369(11.15,1.85) 370(10.85,1.85) 371(10.55,1.85) 372(10.25,1.85) 373(9.95,1.85) 374(9.65,1.85) 375(9.35,1.85) 376(9.05,1.85) 377(8.75,1.85) 378(8.45,1.85) 379(8.15,1.85) 380(7.85,1.85) 381(7.55,1.85) 382(7.25,1.85) 383(6.95,1.85) 384(6.65,1.85) 385(6.35,1.85) 386(6.05,1.85) 387(5.75,1.85) 388(5.45,1.85) 389(5.15,1.85) 390(4.85,1.85) 391(4.55,1.85) 392(4.25,1.85) 393(3.95,1.85) 394(3.65,1.85) 395(3.35,1.85) 396(3.05,1.85) 397(2.75,1.85) 398(2.45,1.85) 399(2.15,1.85) 400(1.85,1.85)